# Altium footprint library Package_DFN_QFN.PcbLib: 557 footprints (part 23 of 35)
Each footprint in its own frame and in the unit in brackets; x right, y up, seen from the top. Pads: shape width x height; smd on the part's side, far side on the other; paste and mask are expansions set on the pad; w line width, h text height; cw(c..) or ccw(c..) is an arc to the next point about the centre after c.
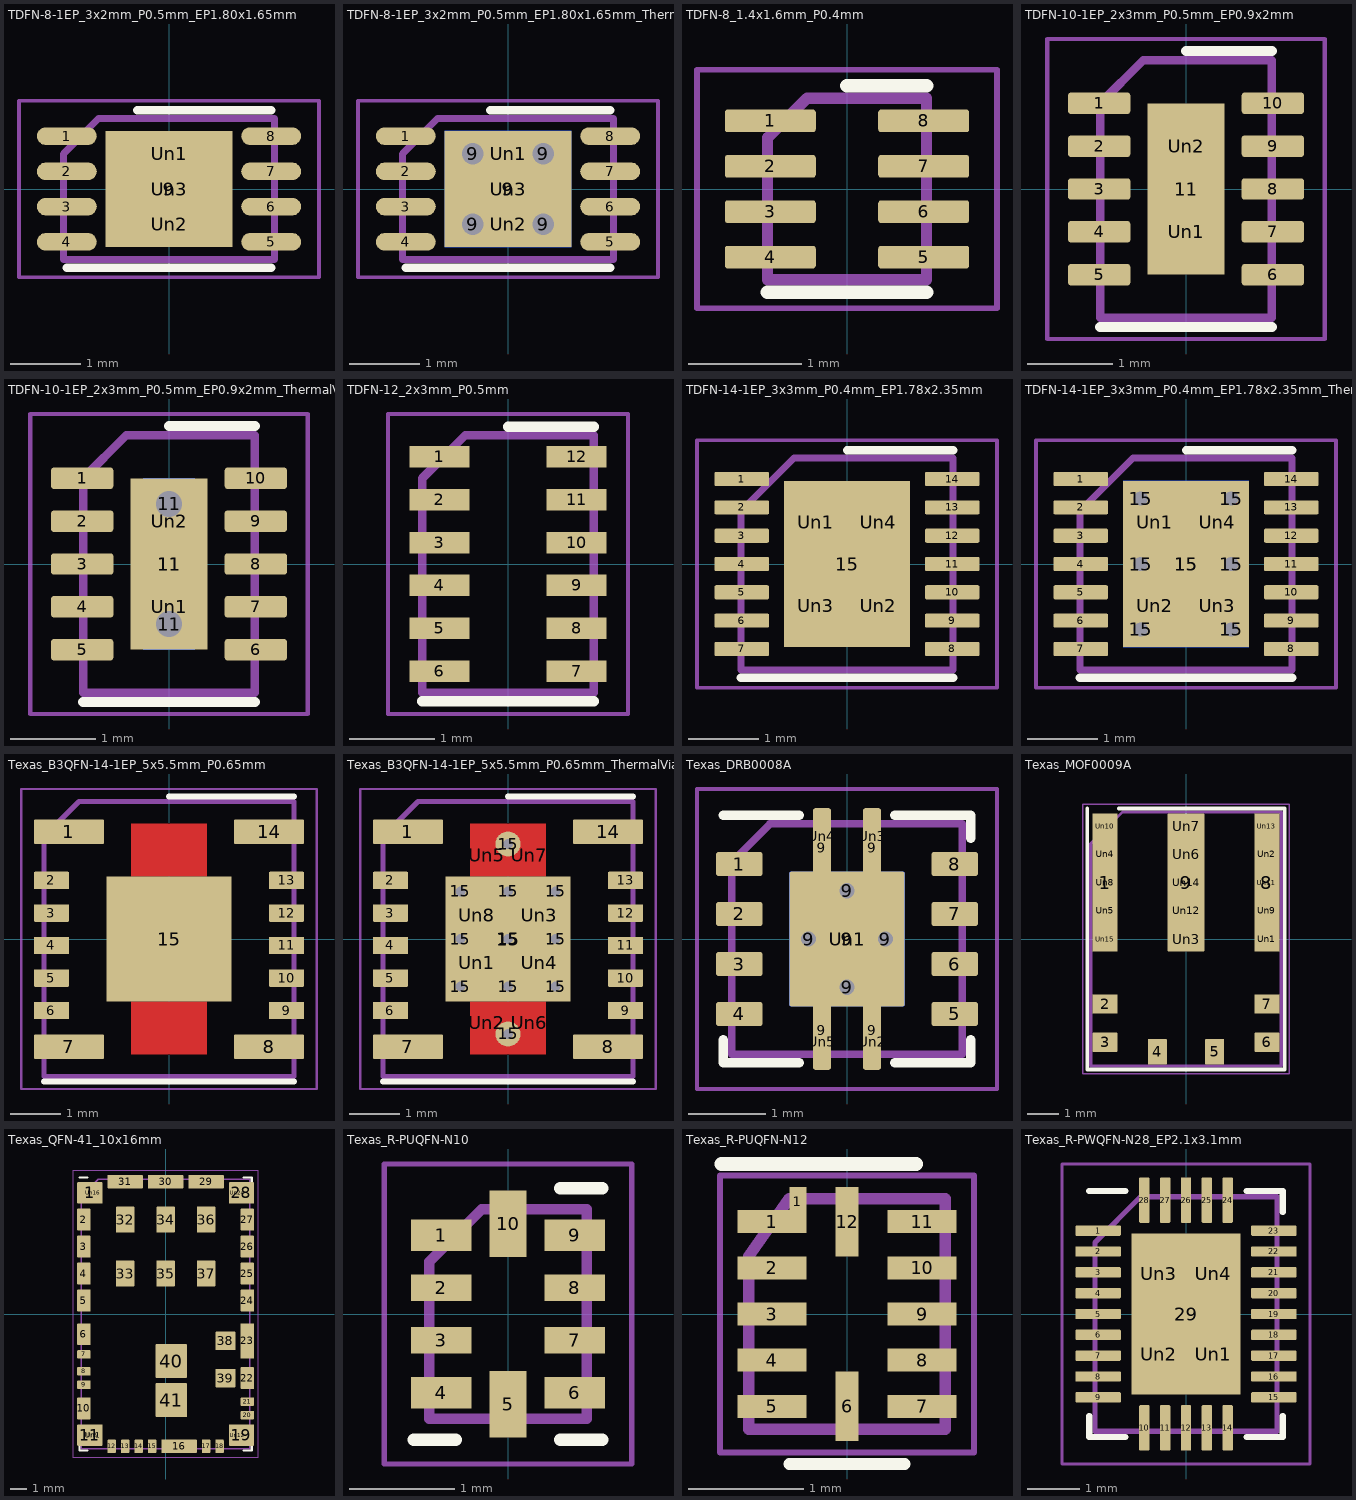
[diagram p22: the footprints below, top view; thin cyan lines are the x and y axes]

## TDFN-8-1EP_3x2mm_P0.5mm_EP1.80x1.65mm [mm]
pads (12):
  rrect100% 0.85x0.25 smd: 1(-1.45,0.75) 2(-1.45,0.25) 3(-1.45,-0.25) 4(-1.45,-0.75) 5(1.45,-0.75) 6(1.45,-0.25) 7(1.45,0.25) 8(1.45,0.75)
  rect 1.8x1.65 smd: 9(0,0)
  rect 0.7x0.65 on Top Paste: Un1(0,0.5) Un2(0,-0.5)
  rect 1.8x0.7 on Top Paste: Un3(0,0)
F.SilkS:
  lines w0.12: -1.45,-1.12 1.45,-1.12 ; -0.45,1.12 1.45,1.12
F.CrtYd:
  lines w0.05: -2.13,-1.25 -2.13,1.25 2.13,1.25 2.13,-1.25 -2.13,-1.25
F.Fab:
  lines w0.1: -1.5,-1 -1.5,0.5 -1,1 1.5,1 1.5,-1 -1.5,-1
  text "'.Designator'" at -2.428,-0.504 h0.6

## TDFN-8-1EP_3x2mm_P0.5mm_EP1.80x1.65mm_ThermalVias [mm]
pads (17):
  rrect100% 0.85x0.25 smd: 1(-1.45,0.75) 2(-1.45,0.25) 3(-1.45,-0.25) 4(-1.45,-0.75) 5(1.45,-0.75) 6(1.45,-0.25) 7(1.45,0.25) 8(1.45,0.75)
  round 0.65 hole 0.3: 9(-0.5,-0.5) 9(-0.5,0.5) 9(0.5,-0.5) 9(0.5,0.5)
  rect 1.8x1.65 smd: 9(0,0)
  rect 1.8x1.65 smd far side: 9(0,0)
  rect 0.7x0.65 on Top Paste: Un1(0,0.5) Un2(0,-0.5)
  rect 1.8x0.7 on Top Paste: Un3(0,0)
F.SilkS:
  lines w0.12: -1.45,-1.12 1.45,-1.12 ; -0.25,1.12 1.45,1.12
F.CrtYd:
  lines w0.05: -2.13,-1.25 2.13,-1.25 2.13,1.25 -2.13,1.25 -2.13,-1.25
F.Fab:
  lines w0.1: -1.5,-1 -1.5,0.5 -1,1 1.5,1 1.5,-1 -1.5,-1
  text "'.Designator'" at -2.428,-0.504 h0.6

## TDFN-8_1.4x1.6mm_P0.4mm [mm]
pads (8):
  rrect25% 0.8x0.2 smd: 1(-0.675,0.6) 2(-0.675,0.2) 3(-0.675,-0.2) 4(-0.675,-0.6) 5(0.675,-0.6) 6(0.675,-0.2) 7(0.675,0.2) 8(0.675,0.6)
F.SilkS:
  lines w0.12: -0.7,-0.91 0.7,-0.91 ; 0,0.91 0.7,0.91
F.CrtYd:
  lines w0.05: -1.32,-1.05 1.32,-1.05 1.32,1.05 -1.32,1.05 -1.32,-1.05
F.Fab:
  lines w0.1: -0.7,-0.8 0.7,-0.8 0.7,0.8 -0.35,0.8 -0.7,0.45 -0.7,-0.8
  text "'.Designator'" at -2.023,-0.42 h0.5

## TDFN-10-1EP_2x3mm_P0.5mm_EP0.9x2mm [mm]
pads (13):
  rrect25% 0.725x0.25 smd: 1(-1.012,1) 2(-1.012,0.5) 3(-1.012,0) 4(-1.012,-0.5) 5(-1.012,-1) 6(1.012,-1) 7(1.012,-0.5) 8(1.012,0) 9(1.012,0.5) 10(1.012,1)
  rect 0.9x2 smd: 11(0,0)
  rrect25% 0.73x0.81 on Top Paste: Un1(0,-0.5) Un2(0,0.5)
F.SilkS:
  lines w0.12: -1,-1.61 1,-1.61 ; 0,1.61 1,1.61
F.CrtYd:
  lines w0.05: -1.62,-1.75 -1.62,1.75 1.62,1.75 1.62,-1.75 -1.62,-1.75
F.Fab:
  lines w0.1: -1,-1.5 -1,1 -0.5,1.5 1,1.5 1,-1.5 -1,-1.5
  text "'.Designator'" at -2.028,-0.425 h0.5

## TDFN-10-1EP_2x3mm_P0.5mm_EP0.9x2mm_ThermalVias [mm]
pads (16):
  rrect25% 0.725x0.25 smd: 1(-1.012,1) 2(-1.012,0.5) 3(-1.012,0) 4(-1.012,-0.5) 5(-1.012,-1) 6(1.012,-1) 7(1.012,-0.5) 8(1.012,0) 9(1.012,0.5) 10(1.012,1)
  round 0.6 hole 0.3: 11(0,-0.7) 11(0,0.7)
  rect 0.9x2 smd: 11(0,0)
  rect 0.6x2 smd far side: 11(0,0)
  rrect25% 0.73x0.81 on Top Paste: Un1(0,-0.5) Un2(0,0.5)
F.SilkS:
  lines w0.12: -1,-1.61 1,-1.61 ; 0,1.61 1,1.61
F.CrtYd:
  lines w0.05: -1.62,-1.75 1.62,-1.75 1.62,1.75 -1.62,1.75 -1.62,-1.75
F.Fab:
  lines w0.1: -1,-1.5 -1,1 -0.5,1.5 1,1.5 1,-1.5 -1,-1.5
  text "'.Designator'" at -2.028,-0.425 h0.5

## TDFN-12_2x3mm_P0.5mm [mm]
pads (12):
  rect 0.7x0.25 smd: 1(-0.8,1.25) 2(-0.8,0.75) 3(-0.8,0.25) 4(-0.8,-0.25) 5(-0.8,-0.75) 6(-0.8,-1.25) 7(0.8,-1.25) 8(0.8,-0.75) 9(0.8,-0.25) 10(0.8,0.25) 11(0.8,0.75) 12(0.8,1.25)
F.SilkS:
  lines w0.12: -1,-1.6 1,-1.6 ; 0,1.6 1,1.6
F.CrtYd:
  lines w0.05: -1.4,-1.75 -1.4,1.75 1.4,1.75 1.4,-1.75 -1.4,-1.75
F.Fab:
  lines w0.1: -1,-1.5 1,-1.5 1,1.5 -0.5,1.5 -1,1 -1,-1.5
  text "'.Designator'" at -1.199,-0.237 h0.3

## TDFN-14-1EP_3x3mm_P0.4mm_EP1.78x2.35mm [mm]
pads (19):
  rrect25% 0.775x0.2 smd: 1(-1.488,1.2) 2(-1.488,0.8) 3(-1.488,0.4) 4(-1.488,0) 5(-1.488,-0.4) 6(-1.488,-0.8) 7(-1.488,-1.2) 8(1.488,-1.2) 9(1.488,-0.8) 10(1.488,-0.4) 11(1.488,0) 12(1.488,0.4) 13(1.488,0.8) 14(1.488,1.2)
  rect 1.78x2.35 smd: 15(0,0)
  rrect25% 0.72x0.95 on Top Paste: Un1(-0.445,0.59) Un2(0.445,-0.59) Un3(-0.445,-0.59) Un4(0.445,0.59)
F.SilkS:
  lines w0.12: -1.5,-1.61 1.5,-1.61 ; 0,1.61 1.5,1.61
F.CrtYd:
  lines w0.05: -2.12,-1.75 -2.12,1.75 2.12,1.75 2.12,-1.75 -2.12,-1.75
F.Fab:
  lines w0.1: -1.5,-1.5 -1.5,0.75 -0.75,1.5 1.5,1.5 1.5,-1.5 -1.5,-1.5
  text "'.Designator'" at -3.033,-0.628 h0.75

## TDFN-14-1EP_3x3mm_P0.4mm_EP1.78x2.35mm_ThermalVias [mm]
pads (26):
  rrect25% 0.775x0.2 smd: 1(-1.488,1.2) 2(-1.488,0.8) 3(-1.488,0.4) 4(-1.488,0) 5(-1.488,-0.4) 6(-1.488,-0.8) 7(-1.488,-1.2) 8(1.488,-1.2) 9(1.488,-0.8) 10(1.488,-0.4) 11(1.488,0) 12(1.488,0.4) 13(1.488,0.8) 14(1.488,1.2)
  round 0.5 hole 0.2: 15(-0.64,-0.925) 15(-0.64,0) 15(-0.64,0.925) 15(0.64,-0.925) 15(0.64,0) 15(0.64,0.925)
  rect 1.78x2.35 smd: 15(0,0)
  rect 1.78x2.35 smd far side: 15(0,0)
  rrect25% 0.77x1.02 on Top Paste: Un1(-0.445,0.59) Un2(-0.445,-0.59) Un3(0.445,-0.59) Un4(0.445,0.59)
F.SilkS:
  lines w0.12: -1.5,-1.61 1.5,-1.61 ; 0,1.61 1.5,1.61
F.CrtYd:
  lines w0.05: -2.12,-1.75 -2.12,1.75 2.12,1.75 2.12,-1.75 -2.12,-1.75
F.Fab:
  lines w0.1: -1.5,-1.5 1.5,-1.5 1.5,1.5 -0.75,1.5 -1.5,0.75 -1.5,-1.5
  text "'.Designator'" at -3.033,-0.628 h0.75

## Texas_B3QFN-14-1EP_5x5.5mm_P0.65mm [mm]
pads (15):
  rrect10% 1.4x0.5 smd: 1(-2,2.145) 7(-2,-2.155) 8(2,-2.155) 14(2,2.145)
  rrect14% 0.7x0.35 smd: 2(-2.35,1.17) 3(-2.35,0.52) 4(-2.35,-0.13) 5(-2.35,-0.78) 6(-2.35,-1.43) 9(2.35,-1.43) 10(2.35,-0.78) 11(2.35,-0.13) 12(2.35,0.52) 13(2.35,1.17)
  rect 2.5x2.5 smd: 15(0,0)
F.Cu:
  region: 0.75,1.25 -0.75,1.25 -0.75,2.3 0.75,2.3
  region: 0.75,-2.3 -0.75,-2.3 -0.75,-1.25 0.75,-1.25
F.SilkS:
  lines w0.12: -2.5,-2.85 2.5,-2.85 ; 0,2.85 2.5,2.85
F.Paste:
  region: 0.75,1.25 -0.75,1.25 -0.75,2.3 0.75,2.3
  region: 0.75,-2.3 -0.75,-2.3 -0.75,-1.25 0.75,-1.25
F.Mask:
  region: 0.75,1.25 -0.75,1.25 -0.75,2.3 0.75,2.3
  region: 0.75,-2.3 -0.75,-2.3 -0.75,-1.25 0.75,-1.25
F.CrtYd:
  lines w0.05: -2.95,-3 -2.95,3 2.95,3 2.95,-3 -2.95,-3
F.Fab:
  lines w0.1: -2.5,-2.75 2.5,-2.75 2.5,2.75 -1.8,2.75 -2.5,2.05 -2.5,-2.75
  text "'.Designator'" at -4.047,-0.84 h1

## Texas_B3QFN-14-1EP_5x5.5mm_P0.65mm_ThermalVia [mm]
pads (34):
  rrect10% 1.4x0.5 smd: 1(-2,2.145) 7(-2,-2.155) 8(2,-2.155) 14(2,2.145)
  rrect14% 0.7x0.35 smd: 2(-2.35,1.17) 3(-2.35,0.52) 4(-2.35,-0.13) 5(-2.35,-0.78) 6(-2.35,-1.43) 9(2.35,-1.43) 10(2.35,-0.78) 11(2.35,-0.13) 12(2.35,0.52) 13(2.35,1.17)
  round 0.5 hole 0.2: 15(-0.95,-0.95) 15(-0.95,0) 15(-0.95,0.95) 15(0,-1.9) 15(0,-0.95) 15(0,0) 15(0,0.95) 15(0,1.9) 15(0.95,-0.95) 15(0.95,0) 15(0.95,0.95)
  rect 2.5x2.5 smd: 15(0,0)
  rrect8% 0.95x0.65 on Top Paste: Un1(-0.625,-0.475) Un3(0.625,0.475) Un4(0.625,-0.475) Un8(-0.625,0.475)
  rrect8% 0.6x1.15 on Top Paste: Un2(-0.425,-1.675) Un5(-0.425,1.675) Un6(0.425,-1.675) Un7(0.425,1.675)
F.Cu:
  region: 0.75,1.25 -0.75,1.25 -0.75,2.3 0.75,2.3
  region: 0.75,-2.3 -0.75,-2.3 -0.75,-1.25 0.75,-1.25
F.SilkS:
  lines w0.12: -2.5,-2.85 2.5,-2.85 ; 0,2.85 2.5,2.85
F.Mask:
  region: 0.75,1.25 -0.75,1.25 -0.75,2.3 0.75,2.3
  region: 0.75,-2.3 -0.75,-2.3 -0.75,-1.25 0.75,-1.25
F.CrtYd:
  lines w0.05: -2.95,-3 2.95,-3 2.95,3 -2.95,3 -2.95,-3
F.Fab:
  lines w0.1: -2.5,-2.75 -2.5,2.05 -1.8,2.75 2.5,2.75 2.5,-2.75 -2.5,-2.75
  text "'.Designator'" at -4.047,-0.84 h1

## Texas_DRB0008A [mm]
pads (23):
  rrect16% 0.6x0.31 smd: 1(-1.4,0.975) 2(-1.4,0.325) 3(-1.4,-0.325) 4(-1.4,-0.975) 5(1.4,-0.975) 6(1.4,-0.325) 7(1.4,0.325) 8(1.4,0.975)
  round 0.5 hole 0.2: 9(-0.5,0) 9(0,-0.625) 9(0,0.625) 9(0.5,0)
  rrect22% 0.23x1.025 smd: 9(-0.325,-1.188) 9(-0.325,1.188) 9(0.325,-1.188) 9(0.325,1.188)
  rrect3% 1.5x1.75 smd far side: 9(0,0)
  rrect3% 1.5x1.75 smd: 9(0,0)
  rrect4% 1.34x1.55 on Top Paste: Un1(0,0)
  rrect22% 0.23x0.725 on Top Paste: Un2(0.325,-1.337) Un3(0.325,1.337) Un4(-0.325,1.337) Un5(-0.325,-1.337)
F.SilkS:
  lines w0.12: -1.61,-1.31 -1.61,-1.61 -0.62,-1.61 ; -1.61,1.61 -0.62,1.61 ; 0.62,-1.61 1.61,-1.61 1.61,-1.31 ; 0.62,1.61 1.61,1.61 1.61,1.31
F.CrtYd:
  lines w0.05: -1.95,-1.95 1.95,-1.95 1.95,1.95 -1.95,1.95 -1.95,-1.95
F.Fab:
  lines w0.1: -1.5,-1.5 1.5,-1.5 1.5,1.5 -1,1.5 -1.5,1 -1.5,-1.5
  text "'.Designator'" at -2.828,-0.583 h0.7

## Texas_MOF0009A [mm]
pads (24):
  rrect6% 0.8x4.35 smd: 1(-2.55,1.777) 8(2.55,1.777)
  rrect8% 0.8x0.6 smd: 2(-2.55,-2.053) 3(-2.55,-3.253) 6(2.55,-3.253) 7(2.55,-2.053)
  rrect8% 0.6x0.8 smd: 4(-0.9,-3.552) 5(0.9,-3.552)
  rrect4% 1.15x4.35 smd: 9(0,1.777)
  rrect8% 0.7x0.59 on Top Paste: Un1(2.55,-0.002) Un2(2.55,2.668) Un4(-2.55,2.668) Un5(-2.55,0.887) Un8(-2.55,1.777) Un9(2.55,0.887) Un10(-2.55,3.558) Un11(2.55,1.777) Un13(2.55,3.558) Un15(-2.55,-0.002)
  rrect8% 1.05x0.59 on Top Paste: Un3(0,-0.002) Un6(0,2.668) Un7(0,3.558) Un12(0,0.887) Un14(0,1.777)
F.SilkS:
  lines w0.12: -3.11,4.11 -3.11,-4.11 3.11,-4.11 3.11,4.11 -2.11,4.11
F.CrtYd:
  lines w0.05: -3.25,-4.25 3.25,-4.25 3.25,4.25 -3.25,4.25 -3.25,-4.25
F.Fab:
  lines w0.1: -3,-4 -3,3 -2,4 3,4 3,-4 -3,-4
  text "'.Designator'" at -4.047,-0.84 h1

## Texas_QFN-41_10x16mm [mm]
pads (65):
  rrect8% 1.5x1.27 smd: 1(-4.5,7.185) 11(-4.5,-7.185) 19(4.5,-7.185) 28(4.5,7.185)
  rrect12% 0.8x1.3 smd: 2(-4.85,5.6) 3(-4.85,4) 4(-4.85,2.4) 5(-4.85,0.8) 6(-4.85,-1.2) 10(-4.85,-5.6) 22(4.85,-3.8) 24(4.85,0.8) 25(4.85,2.4) 26(4.85,4) 27(4.85,5.6)
  rrect20% 0.8x0.5 smd: 7(-4.85,-2.4) 8(-4.85,-3.4) 9(-4.85,-4.2) 20(4.85,-6) 21(4.85,-5.2)
  rrect20% 0.5x0.8 smd: 12(-3.2,-7.85) 13(-2.4,-7.85) 14(-1.6,-7.85) 15(-0.8,-7.85) 17(2.4,-7.85) 18(3.2,-7.85)
  rrect12% 2.1x0.8 smd: 16(0.8,-7.85) 29(2.4,7.85) 30(0,7.85) 31(-2.4,7.85)
  rrect12% 0.8x2.1 smd: 23(4.85,-1.6)
  rrect9% 1.1x1.54 smd: 32(-2.4,5.6) 33(-2.4,2.4) 34(0,5.6) 35(0,2.4) 36(2.4,5.6) 37(2.4,2.4)
  rrect9% 1.2x1.1 smd: 38(3.55,-1.6) 39(3.55,-3.8)
  rrect5% 1.85x2.02 smd: 40(0.335,-2.79) 41(0.335,-5.11)
  rect 0.87x1.07 on Top Solder: Un1(-4.285,-7.185) Un12(4.285,-7.185) Un16(-4.285,7.185) Un24(4.285,7.185)
  rect 0.27x0.6 on Top Paste: Un2(-4.635,4) Un4(4.635,2.4) Un5(4.635,0.8) Un7(4.635,5.6) Un10(4.635,4) Un11(-4.635,-5.6) Un15(-4.635,5.6) Un18(-4.635,-1.2) Un21(4.635,-3.8) Un22(-4.635,0.8) Un23(-4.635,2.4)
  rect 1.6x0.27 on Top Paste: Un3(0,7.635) Un6(0.8,-7.635) Un13(2.4,7.635) Un20(-2.4,7.635)
  rect 0.27x1.6 on Top Paste: Un8(4.635,-1.6)
  rect 0.87x0.87 on Top Paste: Un9(-4.285,-7.185) Un14(4.285,7.185) Un17(4.285,-7.185) Un19(-4.285,7.185)
F.SilkS:
  lines w0.12: -5.11,-8.11 -4.635,-8.11 ; -5.11,-8.1 -5.11,-7.635 ; -5.11,8.11 -4.635,8.11 ; 4.635,-8.11 5.11,-8.11 5.11,-7.635 ; 4.635,8.11 5.11,8.11 5.11,7.635
F.Paste:
  drawing of 41 lines, arcs and shapes, not listed
F.Mask:
  drawing of 41 lines, arcs and shapes, not listed
F.CrtYd:
  lines w0.05: -5.5,-8.5 5.5,-8.5 5.5,8.5 -5.5,8.5 -5.5,-8.5
F.Fab:
  lines w0.1: -5,-8 5,-8 5,8 -4,8 -5,7 -5,-8
  text "'.Designator'" at -4.047,-0.84 h1

## Texas_R-PUQFN-N10 [mm]
pads (10):
  rect 0.575x0.3 smd: 1(-0.637,0.75) 4(-0.637,-0.75) 6(0.637,-0.75) 9(0.637,0.75)
  rect 0.575x0.25 smd: 2(-0.637,0.25) 3(-0.637,-0.25) 7(0.637,-0.25) 8(0.637,0.25)
  rect 0.35x0.63 smd: 5(0,-0.86) 10(0,0.86)
F.SilkS:
  lines w0.12: -0.9,-1.2 -0.5,-1.2 ; 0.5,-1.2 0.9,-1.2 ; 0.5,1.2 0.9,1.2
F.CrtYd:
  lines w0.05: -1.18,-1.43 1.18,-1.43 1.18,1.43 -1.18,1.43 -1.18,-1.43
F.Fab:
  lines w0.1: -0.75,-1 0.75,-1 0.75,1 -0.25,1 -0.75,0.5 -0.75,-1
  text "'.Designator'" at 0.375,-1.978 h0.5

## Texas_R-PUQFN-N12 [mm]
pads (13):
  rect 0.6x0.2 smd: 1(-0.65,0.8) 2(-0.65,0.4) 3(-0.65,0) 4(-0.65,-0.4) 5(-0.65,-0.8) 7(0.65,-0.8) 8(0.65,-0.4) 9(0.65,0) 10(0.65,0.4) 11(0.65,0.8)
  rect 0.15x0.25 smd: 1(-0.425,0.975)
  rect 0.2x0.6 smd: 6(0,-0.8) 12(0,0.8)
F.SilkS:
  lines w0.1: -0.5,-1.3 0.5,-1.3
  lines w0.12: -1.09,1.3 0.6,1.3
F.CrtYd:
  lines w0.05: -1.1,-1.2 -1.1,1.2 1.1,1.2 1.1,-1.2 -1.1,-1.2
F.Fab:
  lines w0.1: -0.85,-1 0.85,-1 0.85,1 -0.5,1 -0.85,0.5 -0.85,-1
  text "'.Designator'" at -1.199,-0.237 h0.3

## Texas_R-PWQFN-N28_EP2.1x3.1mm [mm]
pads (33):
  rrect25% 0.875x0.2 smd: 1(-1.687,1.6) 2(-1.687,1.2) 3(-1.687,0.8) 4(-1.687,0.4) 5(-1.687,0) 6(-1.687,-0.4) 7(-1.687,-0.8) 8(-1.687,-1.2) 9(-1.687,-1.6) 15(1.687,-1.6) 16(1.687,-1.2) 17(1.687,-0.8) 18(1.687,-0.4) 19(1.687,0) 20(1.687,0.4) 21(1.687,0.8) 22(1.687,1.2) 23(1.687,1.6)
  rrect25% 0.2x0.875 smd: 10(-0.8,-2.187) 11(-0.4,-2.187) 12(0,-2.187) 13(0.4,-2.187) 14(0.8,-2.187) 24(0.8,2.187) 25(0.4,2.187) 26(0,2.187) 27(-0.4,2.187) 28(-0.8,2.187)
  rect 2.1x3.1 smd: 29(0,0)
  rrect25% 0.85x1.25 on Top Paste: Un1(0.525,-0.775) Un2(-0.525,-0.775) Un3(-0.525,0.775) Un4(0.525,0.775)
F.SilkS:
  lines w0.12: -1.86,-1.96 -1.86,-2.36 -1.16,-2.36 ; -1.86,2.36 -1.16,2.36 ; 1.16,-2.36 1.86,-2.36 1.86,-1.96 ; 1.16,2.36 1.86,2.36 1.86,1.96
F.CrtYd:
  lines w0.05: -2.38,-2.88 -2.38,2.88 2.38,2.88 2.38,-2.88 -2.38,-2.88
F.Fab:
  lines w0.1: -1.75,-2.25 -1.75,1.375 -0.875,2.25 1.75,2.25 1.75,-2.25 -1.75,-2.25
  text "'.Designator'" at -3.559,-0.737 h0.88